# Altium footprint library ICgeneral.PCBLIB: 48 footprints (part 2 of 3)
Each footprint in its own frame and in the unit in brackets; x right, y up, seen from the top. Pads: shape width x height; smd on the part's side, far side on the other; paste and mask are expansions set on the pad; w line width, h text height; cw(c..) or ccw(c..) is an arc to the next point about the centre after c.
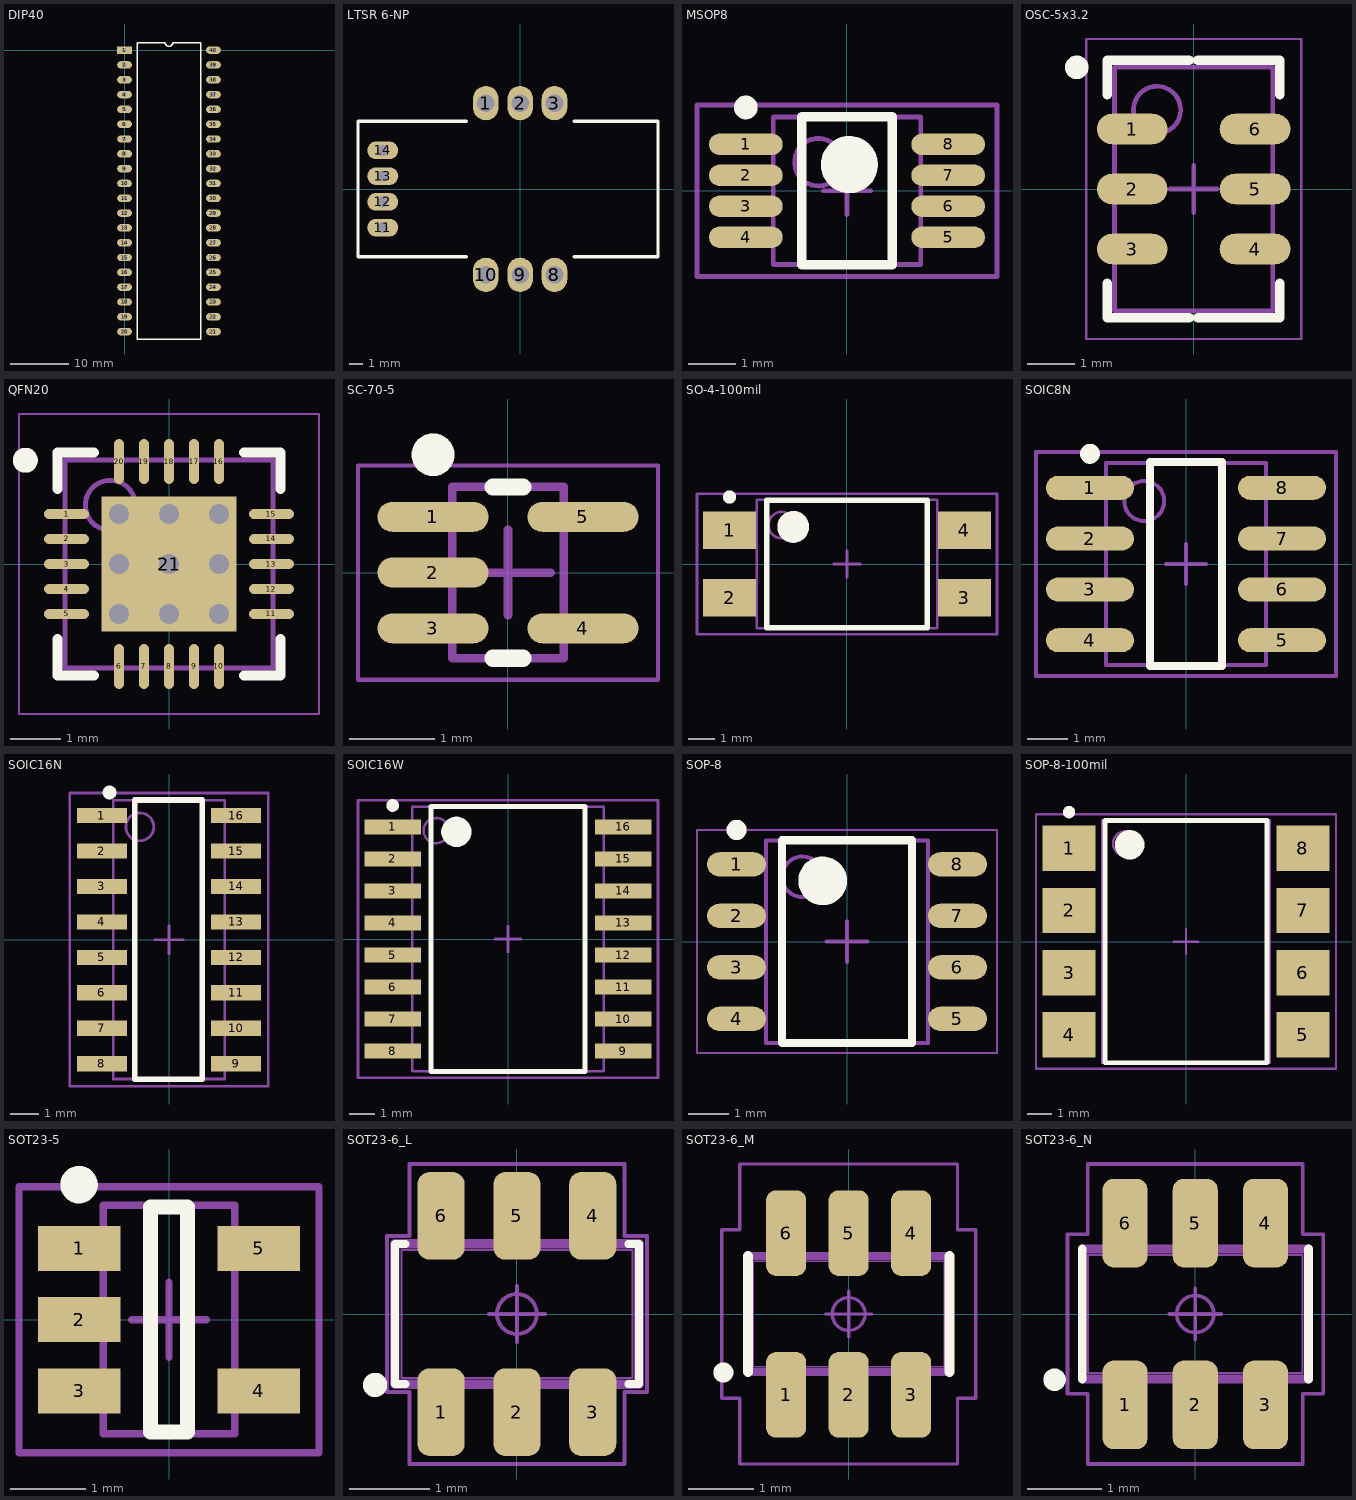
[diagram p1: the footprints below, top view; thin cyan lines are the x and y axes]

## DIP40 [mm]
pads (40):
  rect 2.54x1.27 hole 0.635: 1(0,0)
  oval 2.54x1.27 hole 0.635: 2(0,-2.54) 3(0,-5.08) 4(0,-7.62) 5(0,-10.16) 6(0,-12.7) 7(0,-15.24) 8(0,-17.78) 9(0,-20.32) 10(0,-22.86) 11(0,-25.4) 12(0,-27.94) 13(0,-30.48) 14(0,-33.02) 15(0,-35.56) 16(0,-38.1) 17(0,-40.64) 18(0,-43.18) 19(0,-45.72) 20(0,-48.26) 21(15.24,-48.26) 22(15.24,-45.72) 23(15.24,-43.18) 24(15.24,-40.64) 25(15.24,-38.1) 26(15.24,-35.56) 27(15.24,-33.02) 28(15.24,-30.48) 29(15.24,-27.94) 30(15.24,-25.4) 31(15.24,-22.86) 32(15.24,-20.32) 33(15.24,-17.78) 34(15.24,-15.24) 35(15.24,-12.7) 36(15.24,-10.16) 37(15.24,-7.62) 38(15.24,-5.08) 39(15.24,-2.54) 40(15.24,0)
Top Overlay:
  lines w0.254: 2.159,-49.53 13.081,-49.53 13.081,1.27 8.255,1.27 cw(c7.62,1.27) 6.985,1.27 2.159,1.27 2.159,-49.53
3D body "User Library-DIP40-600.step": height 5.7, standoff -2.58, extent -0.148,-50.342 15.342,2.108

## LTSR 6-NP [mm]
pads (10):
  oval 1.9x2.54 hole 1.3: 1(-2.54,6.35) 2(0,6.35) 3(2.54,6.35) 8(2.54,-6.35) 9(0,-6.35) 10(-2.54,-6.35)
  oval 2.3x1.3 hole 0.8: 11(-10.17,-2.858) 12(-10.17,-0.952) 13(-10.17,0.952) 14(-10.17,2.858)
Top Overlay:
  lines w0.254: -4,-5 -12,-5 -12,5 -4,5 ; 4,-5 10.2,-5 10.2,5 4,5
Top DesignatorDoc:
  text ".Designator" at 0,0 h1.5
3D body "LTSR 6_NP.stp": height 24.01, standoff -3.49, extent -12,-6.75 10.2,6.75

## MSOP8 [mm] "MSOP, 8-Leads, Body 3,1x3,1mm (max), Pitch 0,65mm, IPC Medium Density"
height 1.1
pads (8):
  oval 1.55x0.45 smd: 1(-2.125,0.975) 2(-2.125,0.325) 3(-2.125,-0.325) 4(-2.125,-0.975) 5(2.125,-0.975) 6(2.125,-0.325) 7(2.125,0.325) 8(2.125,0.975)
Top Overlay:
  circle w0.6: c0.05,0.55 r0.3
  circle w0.25: c-2.125,1.75 r0.125
  lines w0.2: -0.95,-1.55 0.95,-1.55 0.95,1.55 -0.95,1.55 -0.95,-1.55
Top Body, 3D Models:
  circle w0.1: c-0.6,0.6 r0.5
  lines w0.1: -1.55,-1.55 1.55,-1.55 1.55,1.55 -1.55,1.55 -1.55,-1.55
Courtyard Top:
  lines w0.1: -0.5,0 0.5,0 ; 0,-0.5 0,0.5 ; -3.15,-1.8 3.15,-1.8 3.15,1.8 -3.15,1.8 -3.15,-1.8
Top DesignatorDoc:
  text ".Designator" at 0,0 h1.5
3D body "User Library-msop-8.step": height 1.15, standoff 0, extent -2.45,-1.5 2.45,1.5

## OSC-5x3.2 [mm] "QFN, 6-Leads, Body 3.35x5.15mm, Pitch 1.27mm, IPC Medium Density"
height 1.4
pads (6):
  oval 1.5x0.65 smd: 1(-1.3,1.27) 2(-1.3,0) 3(-1.3,-1.27) 4(1.3,-1.27) 5(1.3,0) 6(1.3,1.27)
Top Overlay:
  circle w0.25: c-2.475,2.575 r0.125
  lines w0.2: -1.825,-1.995 -1.825,-2.725 -0.09,-2.725 ; -1.825,1.995 -1.825,2.725 -0.09,2.725 ; 0.09,-2.725 1.825,-2.725 1.825,-1.995 ; 0.09,2.725 1.825,2.725 1.825,1.995
Top Body, 3D Models:
  circle w0.1: c-0.775,1.675 r0.5
  lines w0.1: -1.675,-2.575 1.675,-2.575 1.675,2.575 -1.675,2.575 -1.675,-2.575
Courtyard Top:
  lines w0.05: -2.275,-3.175 2.275,-3.175 2.275,3.175 -2.275,3.175 -2.275,-3.175
  lines w0.1: -0.5,0 0.5,0 ; 0,-0.5 0,0.5
Top DesignatorDoc:
  text ".Designator" at 0,0 h1.5
3D body "User Library-FXO_LC53.step": height 1.39, standoff -0.01, extent -1.675,-2.575 1.675,2.575

## QFN20 [mm] "QFN, 20-Leads, Body 4.00x4.00mm, Pitch 0.50mm, Thermal Pad 2.70x2.70mm, IPC Low Density"
height 1
pads (21):
  oval 0.9x0.2 smd: 1(-2.05,1) 2(-2.05,0.5) 3(-2.05,0) 4(-2.05,-0.5) 5(-2.05,-1) 11(2.05,-1) 12(2.05,-0.5) 13(2.05,0) 14(2.05,0.5) 15(2.05,1)
  oval 0.2x0.9 smd: 6(-1,-2.05) 7(-0.5,-2.05) 8(0,-2.05) 9(0.5,-2.05) 10(1,-2.05) 16(1,2.05) 17(0.5,2.05) 18(0,2.05) 19(-0.5,2.05) 20(-1,2.05)
  rect 2.7x2.7 smd: 21(0,0)
via 0,1 diameter 0.7 hole 0.4
via 1,0 diameter 0.7 hole 0.4
via -1,0 diameter 0.7 hole 0.4
via 0,0 diameter 0.7 hole 0.4
via 0,-1 diameter 0.7 hole 0.4
via 1,1 diameter 0.7 hole 0.4
via -1,1 diameter 0.7 hole 0.4
via -1,-1 diameter 0.7 hole 0.4
via 1,-1 diameter 0.7 hole 0.4
Top Overlay:
  circle w0.25: c-2.875,2.075 r0.125
  lines w0.2: -2.225,-1.5 -2.225,-2.225 -1.5,-2.225 ; -2.225,1.5 -2.225,2.225 -1.5,2.225 ; 1.5,-2.225 2.225,-2.225 2.225,-1.5 ; 1.5,2.225 2.225,2.225 2.225,1.5
Top Body, 3D Models:
  circle w0.1: c-1.175,1.175 r0.5
  lines w0.1: -2.075,-2.075 -2.075,2.075 2.075,2.075 2.075,-2.075 -2.075,-2.075
Courtyard Top:
  lines w0.05: -3,-3 -3,3 3,3 3,-3 -3,-3
  lines w0.1: -0.5,0 0.5,0 ; 0,-0.5 0,0.5
Top DesignatorDoc:
  text ".Designator" at 0,0 h1.5
3D body "User Library-qfn20-4x4.step": height 0.92, standoff 0, extent -2,-2 2,2

## SC-70-5 [mm] "SC-70, 5-Leads, Body 2.00x1.25mm, Pitch 0.65mm, IPC Medium Density"
height 1.1
pads (5):
  oval 1.3x0.35 smd: 1(-0.875,0.65) 2(-0.875,0) 3(-0.875,-0.65) 4(0.875,-0.65) 5(0.875,0.65)
Top Overlay:
  circle w0.25: c-0.875,1.375 r0.125
  lines w0.2: -0.175,-1 0.175,-1 ; -0.175,1 0.175,1
Top Body, 3D Models:
  lines w0.1: -0.65,-1 -0.65,1 0.65,1 0.65,-1 -0.65,-1
Courtyard Top:
  lines w0.05: -1.75,-1.25 -1.75,1.25 1.75,1.25 1.75,-1.25 -1.75,-1.25
  lines w0.1: -0.5,0 0.5,0 ; 0,-0.5 0,0.5
Top DesignatorDoc:
  text ".Designator" at 0,0 h1
3D body "User Library-sot353.step": height 1, standoff 0, extent -1.15,-1.05 1.15,1.05

## SO-4-100mil [mm] "SOP, 4-Leads, Body 4,8x6,8mm (max), Pitch 2,54mm, IPC Medium Density"
height 3.8
pads (4):
  rect 2x1.4 smd: 1(-4.425,1.27) 2(-4.425,-1.27) 3(4.425,-1.27) 4(4.425,1.27)
Top Overlay:
  circle w0.6: c-2.025,1.4 r0.3
  circle w0.25: c-4.425,2.52 r0.125
  lines w0.2: -3.025,-2.4 3.025,-2.4 3.025,2.4 -3.025,2.4 -3.025,-2.4
Top Body, 3D Models:
  circle w0.1: c-2.455,1.465 r0.5
  lines w0.1: -3.405,-2.415 3.405,-2.415 3.405,2.415 -3.405,2.415 -3.405,-2.415
Courtyard Top:
  lines w0.1: -0.5,0 0.5,0 ; 0,-0.5 0,0.5 ; -5.65,-2.65 5.65,-2.65 5.65,2.65 -5.65,2.65 -5.65,-2.65
Top DesignatorDoc:
  text ".Designator" at 0,0 h1.5
3D body: height 3.8, standoff 0.1, extent -3.405,-2.415 3.405,2.415

## SOIC8N [mm]
height 1.75
pads (8):
  oval 2.2x0.6 smd: 1(-2.4,1.905) 2(-2.4,0.635) 3(-2.4,-0.635) 4(-2.4,-1.905) 5(2.4,-1.905) 6(2.4,-0.635) 7(2.4,0.635) 8(2.4,1.905)
Top Overlay:
  circle w0.25: c-2.4,2.755 r0.125
  lines w0.2: -0.9,-2.55 0.9,-2.55 0.9,2.55 -0.9,2.55 -0.9,-2.55
Top Body, 3D Models:
  circle w0.1: c-1.045,1.575 r0.5
  lines w0.1: -1.995,-2.525 1.995,-2.525 1.995,2.525 -1.995,2.525 -1.995,-2.525
Courtyard Top:
  lines w0.1: -0.5,0 0.5,0 ; 0,-0.5 0,0.5 ; -3.75,-2.8 3.75,-2.8 3.75,2.8 -3.75,2.8 -3.75,-2.8
Top DesignatorDoc:
  text ".Designator" at 0,0 h1.5
3D body "User Library-SOIC.step": height 1.72, standoff 0.02, extent -3.124,-2.413 3.073,2.413

## SOIC16N [mm]
height 1.75
pads (16):
  rect 1.8x0.55 smd: 1(-2.4,4.445) 2(-2.4,3.175) 3(-2.4,1.905) 4(-2.4,0.635) 5(-2.4,-0.635) 6(-2.4,-1.905) 7(-2.4,-3.175) 8(-2.4,-4.445) 9(2.4,-4.445) 10(2.4,-3.175) 11(2.4,-1.905) 12(2.4,-0.635) 13(2.4,0.635) 14(2.4,1.905) 15(2.4,3.175) 16(2.4,4.445)
Top Overlay:
  circle w0.25: c-2.125,5.27 r0.125
  lines w0.2: -1.219,-5 -1.219,5 1.194,5 1.194,-5 -1.219,-5
Top Body, 3D Models:
  circle w0.1: c-1.045,4.04 r0.5
  lines w0.1: -1.995,-4.99 -1.995,4.99 1.995,4.99 1.995,-4.99 -1.995,-4.99
Courtyard Top:
  lines w0.1: -0.5,0 0.5,0 ; 0,-0.5 0,0.5 ; -3.55,-5.25 -3.55,5.25 3.55,5.25 3.55,-5.25 -3.55,-5.25
Top DesignatorDoc:
  text ".Designator" at 0,0 h1.5
3D body "User Library-SOIC-16.step": height 1.4, standoff 0, extent -2.974,-4.95 3.026,4.95

## SOIC16W [mm] "SOIC, 16-Leads, Body 10,5x7,6mm (max), Pitch 1,27mm, IPC Medium Density"
height 2.65
pads (16):
  rect 2.25x0.6 smd: 1(-4.575,4.445) 2(-4.575,3.175) 3(-4.575,1.905) 4(-4.575,0.635) 5(-4.575,-0.635) 6(-4.575,-1.905) 7(-4.575,-3.175) 8(-4.575,-4.445) 9(4.575,-4.445) 10(4.575,-3.175) 11(4.575,-1.905) 12(4.575,-0.635) 13(4.575,0.635) 14(4.575,1.905) 15(4.575,3.175) 16(4.575,4.445)
Top Overlay:
  circle w0.25: c-4.575,5.295 r0.125
  circle w0.6: c-2.05,4.25 r0.3
  lines w0.2: -3.05,-5.25 -3.05,5.25 3.05,5.25 3.05,-5.25 -3.05,-5.25
Top Body, 3D Models:
  circle w0.1: c-2.85,4.3 r0.5
  lines w0.1: -3.8,-5.25 -3.8,5.25 3.8,5.25 3.8,-5.25 -3.8,-5.25
Courtyard Top:
  lines w0.1: -0.5,0 0.5,0 ; 0,-0.5 0,0.5 ; -5.95,-5.5 -5.95,5.5 5.95,5.5 5.95,-5.5 -5.95,-5.5
Top DesignatorDoc:
  text ".Designator" at 0,0 h1.5
3D body: height 2.65, standoff 0.1, extent -3.8,-5.25 3.8,5.25

## SOP-8 [mm] "SOIC, 8-Leads, Body 4.90x3.90mm, Pitch 1.27mm, IPC Medium Density"
height 1.75
pads (8):
  oval 1.45x0.6 smd: 1(-2.725,1.905) 2(-2.725,0.635) 3(-2.725,-0.635) 4(-2.725,-1.905) 5(2.725,-1.905) 6(2.725,-0.635) 7(2.725,0.635) 8(2.725,1.905)
Top Overlay:
  circle w0.6: c-0.6,1.5 r0.3
  circle w0.25: c-2.725,2.755 r0.125
  lines w0.2: -1.6,-2.5 1.6,-2.5 1.6,2.5 -1.6,2.5 -1.6,-2.5
Top Body, 3D Models:
  circle w0.1: c-1.1,1.6 r0.5
  lines w0.1: -2,-2.5 2,-2.5 2,2.5 -2,2.5 -2,-2.5
Courtyard Top:
  lines w0.05: -3.7,-2.75 3.7,-2.75 3.7,2.75 -3.7,2.75 -3.7,-2.75
  lines w0.1: -0.5,0 0.5,0 ; 0,-0.5 0,0.5
Top DesignatorDoc:
  text ".Designator" at 0,0 h1.5
3D body "SOP-8.step": height 1.75, standoff 0, extent -3,-2.5 3,2.5

## SOP-8-100mil [mm]
height 5.08
pads (8):
  rect 2.15x1.85 smd: 1(-4.775,3.81) 2(-4.775,1.27) 3(-4.775,-1.27) 4(-4.775,-3.81) 5(4.775,-3.81) 6(4.775,-1.27) 7(4.775,1.27) 8(4.775,3.81)
Top Overlay:
  circle w0.6: c-2.3,3.95 r0.3
  circle w0.25: c-4.775,5.285 r0.125
  lines w0.2: -3.3,-4.95 3.3,-4.95 3.3,4.95 -3.3,4.95 -3.3,-4.95
Top Body, 3D Models:
  circle w0.1: c-2.48,4.005 r0.5
  lines w0.1: -3.43,-4.955 3.43,-4.955 3.43,4.955 -3.43,4.955 -3.43,-4.955
Courtyard Top:
  lines w0.1: -0.5,0 0.5,0 ; 0,-0.5 0,0.5 ; -6.125,-5.2 6.125,-5.2 6.125,5.2 -6.125,5.2 -6.125,-5.2
Top DesignatorDoc:
  text ".Designator" at 0,0 h1.5
3D body: height 5.08, standoff 0.5, extent -3.43,-4.955 3.43,4.955

## SOT23-5 [mm] "SOT23, 5-Leads, Body 3.0x3.0mm (max), Pitch 0.95mm, IPC Medium Density"
height 1.45
pads (5):
  rect 1.1x0.6 smd: 1(-1.2,0.95) 2(-1.2,0) 3(-1.2,-0.95) 4(1.2,-0.95) 5(1.2,0.95)
Top Overlay:
  circle w0.25: c-1.2,1.8 r0.125
  lines w0.2: -0.25,-1.5 0.25,-1.5 0.25,1.5 -0.25,1.5 -0.25,-1.5
Top Body, 3D Models:
  lines w0.1: -0.875,-1.525 -0.875,1.525 0.875,1.525 0.875,-1.525 -0.875,-1.525
Courtyard Top:
  lines w0.1: -0.5,0 0.5,0 ; 0,-0.5 0,0.5 ; -2,-1.775 -2,1.775 2,1.775 2,-1.775 -2,-1.775
Top DesignatorDoc:
  text ".Designator" at 0,0 h1.5
3D body "User Library-SOT23-5-1.step": height 1.3, standoff 0, extent -1.476,-1.5 1.524,1.5

## SOT23-6_L [mm] "Small Outline Transistor (SOT23), 0.95 mm pitch; 6 pin, 2.90 mm L X 1.60 mm W X 1.10 mm H body"
height 1.1
pads (6):
  rrect51% 0.59x1.1 smd: 1(-0.95,-1.23) 2(0,-1.23) 3(0.95,-1.23) 4(0.95,1.23) 5(0,1.23) 6(-0.95,1.23)
Top Overlay:
  circle w0.152: c-1.778,-0.889 r0.076
  lines w0.1: -1.395,-0.88 -1.53,-0.88 -1.53,0.88 -1.395,0.88 ; 1.395,-0.88 1.53,-0.88 1.53,0.88 1.395,0.88
Top Dimensions:
  lines w0.12: -1.53,-0.88 -1.53,0.88 1.53,0.88 1.53,-0.88 -1.53,-0.88
Bottom Dimensions:
  lines w0.025: -1.45,-0.8 -1.45,0.8 1.45,0.8 1.45,-0.8 -1.45,-0.8 ; -1.15,-1.4 -0.75,-1.4 -0.75,-0.95 -1.15,-0.95 -1.15,-1.4 ; -1.15,0.95 -0.75,0.95 -0.75,1.4 -1.15,1.4 -1.15,0.95 ; -0.2,-1.4 0.2,-1.4 0.2,-0.95 -0.2,-0.95 -0.2,-1.4 ; -0.2,0.95 0.2,0.95 0.2,1.4 -0.2,1.4 -0.2,0.95 ; 0.75,-1.4 1.15,-1.4 1.15,-0.95 0.75,-0.95 0.75,-1.4 ; 0.75,0.95 1.15,0.95 1.15,1.4 0.75,1.4 0.75,0.95
Courtyard Top:
  circle w0.05: c0,0 r0.25
  lines w0.05: -0.35,0 0.35,0 ; 0,-0.35 0,0.35 ; -1.63,-0.98 -1.63,0.98 -1.345,0.98 -1.345,1.88 1.345,1.88 1.345,0.98 1.63,0.98 1.63,-0.98 1.345,-0.98 1.345,-1.88 -1.345,-1.88 -1.345,-0.98 -1.63,-0.98
Top DesignatorDoc:
  text ".Designator" at 0,0 h1
3D body "SOT23-6_L.STEP": height 1.1, standoff 0, extent -1.45,-1.4 1.45,1.4

## SOT23-6_M [mm] "Small Outline Transistor (SOT23), 0.95 mm pitch; 6 pin, 2.90 mm L X 1.60 mm W X 1.10 mm H body"
height 1.1
pads (6):
  rrect49% 0.61x1.3 smd: 1(-0.95,-1.23) 2(0,-1.23) 3(0.95,-1.23) 4(0.95,1.23) 5(0,1.23) 6(-0.95,1.23)
Top Overlay:
  circle w0.152: c-1.905,-0.889 r0.076
  lines w0.15: -1.53,-0.88 -1.53,0.88 ; 1.53,-0.88 1.53,0.88
Top Dimensions:
  lines w0.12: -1.53,-0.88 1.53,-0.88 1.53,0.88 -1.53,0.88 -1.53,-0.88
Bottom Dimensions:
  lines w0.025: -1.45,-0.8 1.45,-0.8 1.45,0.8 -1.45,0.8 -1.45,-0.8 ; -1.15,-1.4 -1.15,-0.95 -0.75,-0.95 -0.75,-1.4 -1.15,-1.4 ; -1.15,0.95 -1.15,1.4 -0.75,1.4 -0.75,0.95 -1.15,0.95 ; -0.2,-1.4 -0.2,-0.95 0.2,-0.95 0.2,-1.4 -0.2,-1.4 ; -0.2,0.95 -0.2,1.4 0.2,1.4 0.2,0.95 -0.2,0.95 ; 0.75,-1.4 0.75,-0.95 1.15,-0.95 1.15,-1.4 0.75,-1.4 ; 0.75,0.95 0.75,1.4 1.15,1.4 1.15,0.95 0.75,0.95
Courtyard Top:
  circle w0.05: c0,0 r0.25
  lines w0.05: -0.35,0 0.35,0 ; 0,-0.35 0,0.35 ; -1.93,-1.28 -1.655,-1.28 -1.655,-2.28 1.655,-2.28 1.655,-1.28 1.93,-1.28 1.93,1.28 1.655,1.28 1.655,2.28 -1.655,2.28 -1.655,1.28 -1.93,1.28 -1.93,-1.28
Top DesignatorDoc:
  text ".Designator" at 0,0 h1.5
3D body "SOT23-6_M.STEP": height 1.1, standoff 0, extent -1.45,-1.4 1.45,1.4

## SOT23-6_N [mm] "Small Outline Transistor (SOT23), 0.95 mm pitch; 6 pin, 2.90 mm L X 1.60 mm W X 1.10 mm H body"
height 1.1
pads (6):
  rrect49% 0.61x1.2 smd: 1(-0.95,-1.23) 2(0,-1.23) 3(0.95,-1.23) 4(0.95,1.23) 5(0,1.23) 6(-0.95,1.23)
Top Overlay:
  circle w0.152: c-1.905,-0.889 r0.076
  lines w0.12: -1.53,-0.88 -1.53,0.88 ; 1.53,-0.88 1.53,0.88
Top Dimensions:
  lines w0.12: -1.53,-0.88 1.53,-0.88 1.53,0.88 -1.53,0.88 -1.53,-0.88
Bottom Dimensions:
  lines w0.025: -1.45,-0.8 1.45,-0.8 1.45,0.8 -1.45,0.8 -1.45,-0.8 ; -1.15,-1.4 -1.15,-0.95 -0.75,-0.95 -0.75,-1.4 -1.15,-1.4 ; -1.15,0.95 -1.15,1.4 -0.75,1.4 -0.75,0.95 -1.15,0.95 ; -0.2,-1.4 -0.2,-0.95 0.2,-0.95 0.2,-1.4 -0.2,-1.4 ; -0.2,0.95 -0.2,1.4 0.2,1.4 0.2,0.95 -0.2,0.95 ; 0.75,-1.4 0.75,-0.95 1.15,-0.95 1.15,-1.4 0.75,-1.4 ; 0.75,0.95 0.75,1.4 1.15,1.4 1.15,0.95 0.75,0.95
Courtyard Top:
  circle w0.05: c0,0 r0.25
  lines w0.05: -0.35,0 0.35,0 ; 0,-0.35 0,0.35 ; -1.73,-1.08 -1.455,-1.08 -1.455,-2.03 1.455,-2.03 1.455,-1.08 1.73,-1.08 1.73,1.08 1.455,1.08 1.455,2.03 -1.455,2.03 -1.455,1.08 -1.73,1.08 -1.73,-1.08
Top DesignatorDoc:
  text ".Designator" at 0,0 h1.2
3D body "SOT23-6_N.STEP": height 1.1, standoff 0, extent -1.45,-1.4 1.45,1.4